# Altium footprint library XU-GENARAL PCB .PcbLib: 1176 footprints (part 24 of 75)
Each footprint in its own frame and in the unit in brackets; x right, y up, seen from the top. Pads: shape width x height; smd on the part's side, far side on the other; paste and mask are expansions set on the pad; w line width, h text height; cw(c..) or ccw(c..) is an arc to the next point about the centre after c.
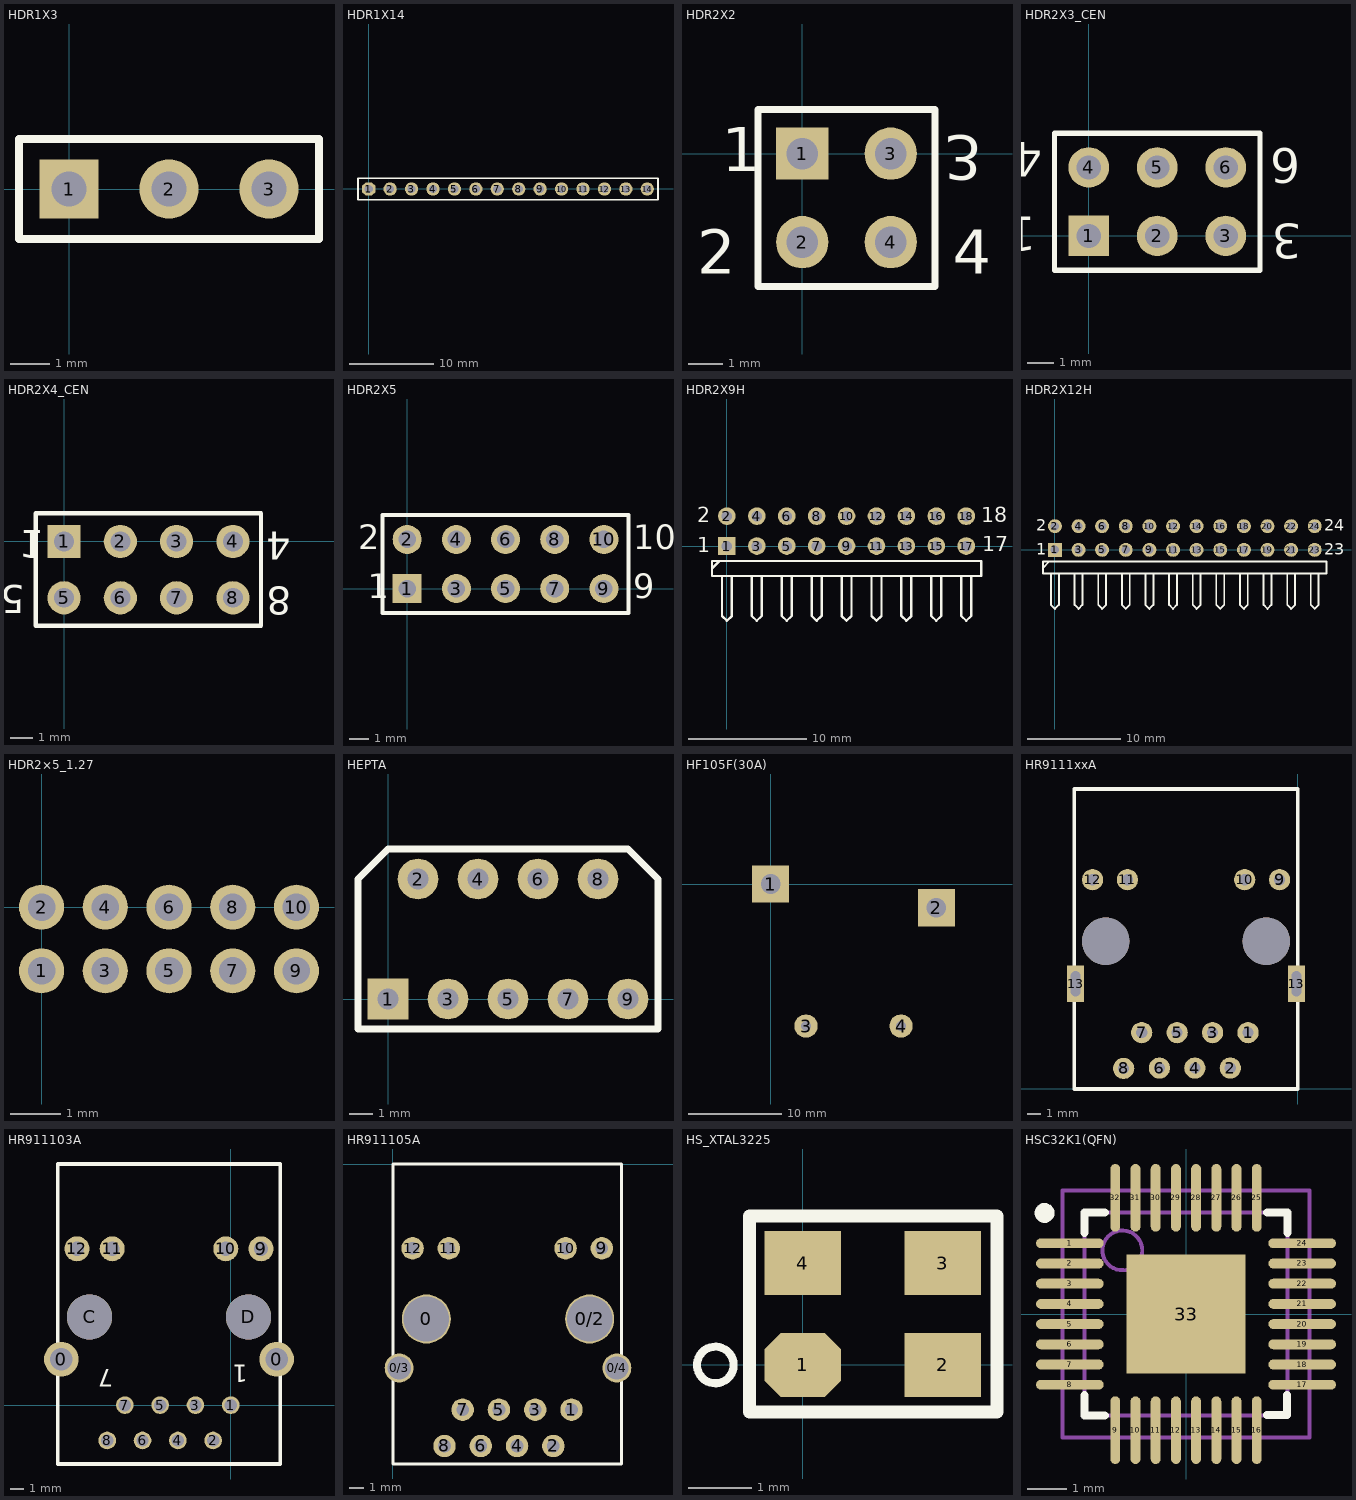
[diagram p23: the footprints below, top view; thin cyan lines are the x and y axes]

## HDR1X3 [mm] "Connector; Header; 3 Position"
height 1.75
pads (3):
  rect 1.5x1.5 hole 0.9: 1(0,0)
  round 1.5 hole 0.9: 2(2.54,0) 3(5.08,0)
Top Overlay:
  lines w0.2: -1.27,-1.27 6.35,-1.27 6.35,1.27 -1.27,1.27 -1.27,-1.27

## HDR1X14 [mil]
pads (14):
  oct 62x62 hole 38: 1(-0.26,-0.26)
  round 62 hole 38: 2(99.74,-0.26) 3(199.74,-0.26) 4(299.74,-0.26) 5(399.74,-0.26) 6(499.74,-0.26) 7(599.74,-0.26) 8(699.74,-0.26) 9(799.74,-0.26) 10(899.74,-0.26) 11(999.74,-0.26) 12(1099.74,-0.26) 13(1199.74,-0.26) 14(1299.74,-0.26)
Top Overlay:
  lines w8: -50.26,-50.26 1349.74,-50.26 1349.74,49.74 24.74,49.74 -50.26,49.74 -50.26,-50.26

## HDR2X2 [mm] "Connector; Header; 2x2 Position"
height 1.75
pads (4):
  rect 1.5x1.5 hole 0.9: 1(0,0)
  round 1.5 hole 0.9: 2(0,-2.54) 3(2.54,0) 4(2.54,-2.54)
Top Overlay:
  lines w0.2: -1.27,-3.81 3.81,-3.81 3.81,1.27 -1.27,1.27 -1.27,-3.81
  text "1" at -2.311,-0.508 h1.27
  text "2" at -3.023,-3.454 h1.27
  text "4" at 4.318,-3.454 h1.27
  text "3" at 4.064,0.508 h1.27

## HDR2X3_CEN [mm] "Connector; Header; 3x2 Position"
height 1.75
pads (6):
  rect 1.5x1.5 hole 0.9: 1(0,0)
  round 1.5 hole 0.9: 2(2.54,0) 3(5.08,0) 4(0,2.54) 5(2.54,2.54) 6(5.08,2.54)
Top Overlay:
  lines w0.2: -1.27,-1.27 -1.27,3.81 6.35,3.81 6.35,-1.27 -1.27,-1.27
  text "4" at -1.727,3.48 h1.27
  text "1" at -1.956,0.711 h1.27
  text "3" at 7.899,0.457 h1.27
  text "6" at 7.849,3.251 h1.27

## HDR2X4_CEN [mm] "Connector; Header; 4x2 Position"
height 1.75
pads (8):
  rect 1.5x1.5 hole 0.9: 1(0,0)
  round 1.5 hole 0.9: 2(2.54,0) 3(5.08,0) 4(7.62,0) 5(0,-2.54) 6(2.54,-2.54) 7(5.08,-2.54) 8(7.62,-2.54)
Top Overlay:
  lines w0.2: -1.27,-3.81 8.89,-3.81 8.89,1.27 -1.27,1.27 -1.27,-3.81
  text "8" at 9.144,-2.032 h1.27
  text "4" at 10.236,0.432 h1.27
  text "1" at -2.032,0.508 h1.27
  text "5" at -1.778,-1.981 h1.27

## HDR2X5 [mm] "Connector; Header; 5x2 Position"
height 1.75
pads (10):
  rect 1.5x1.5 hole 0.9: 1(0,0)
  round 1.5 hole 0.9: 2(0,2.54) 3(2.54,0) 4(2.54,2.54) 5(5.08,0) 6(5.08,2.54) 7(7.62,0) 8(7.62,2.54) 9(10.16,0) 10(10.16,2.54)
Top Overlay:
  lines w0.2: -1.27,-1.27 -1.27,3.81 11.43,3.81 11.43,-1.27 -1.27,-1.27
  text "2" at -2.54,2.032 h1.27
  text "1" at -2.032,-0.508 h1.27
  text "9" at 11.684,-0.508 h1.27
  text "10" at 11.684,2.032 h1.27

## HDR2X9H [mm] "Connector; Header; 9x2 Position; Right Angle"
height 1.75
pads (18):
  rect 1.5x1.5 hole 0.9: 1(0,0)
  round 1.5 hole 0.9: 2(0,2.54) 3(2.54,0) 4(2.54,2.54) 5(5.08,0) 6(5.08,2.54) 7(7.62,0) 8(7.62,2.54) 9(10.16,0) 10(10.16,2.54) 11(12.7,0) 12(12.7,2.54) 13(15.24,0) 14(15.24,2.54) 15(17.78,0) 16(17.78,2.54) 17(20.32,0) 18(20.32,2.54)
Top Overlay:
  lines w0.2: -1.27,-1.905 -0.635,-1.27 ; -0.423,-2.54 -0.423,-5.927 0,-6.35 0.423,-5.927 0.423,-2.54 ; 2.117,-2.54 2.117,-5.927 2.54,-6.35 2.963,-5.927 2.963,-2.54 ; 4.657,-2.54 4.657,-5.927 5.08,-6.35 5.503,-5.927 5.503,-2.54 ; 7.197,-2.54 7.197,-5.927 7.62,-6.35 8.043,-5.927 8.043,-2.54 ; 9.737,-2.54 9.737,-5.927 10.16,-6.35 10.583,-5.927 10.583,-2.54 ; 12.277,-2.54 12.277,-5.927 12.7,-6.35 13.123,-5.927 13.123,-2.54 ; 14.817,-2.54 14.817,-5.927 15.24,-6.35 15.663,-5.927 15.663,-2.54 ; 17.357,-2.54 17.357,-5.927 17.78,-6.35 18.203,-5.927 18.203,-2.54 ; 19.897,-2.54 19.897,-5.927 20.32,-6.35 20.743,-5.927 20.743,-2.54 ; -1.27,-2.54 -1.27,-1.27 21.59,-1.27 21.59,-2.54 -1.27,-2.54
  text "1" at -2.54,-0.508 h1.27
  text "17" at 21.664,-0.44 h1.27
  text "18" at 21.593,2.032 h1.27
  text "2" at -2.54,2.032 h1.27

## HDR2X12H [mm] "Connector; Header; 12x2 Position; Right Angle"
height 1.75
pads (24):
  rect 1.5x1.5 hole 0.9: 1(0,0)
  round 1.5 hole 0.9: 2(0,2.54) 3(2.54,0) 4(2.54,2.54) 5(5.08,0) 6(5.08,2.54) 7(7.62,0) 8(7.62,2.54) 9(10.16,0) 10(10.16,2.54) 11(12.7,0) 12(12.7,2.54) 13(15.24,0) 14(15.24,2.54) 15(17.78,0) 16(17.78,2.54) 17(20.32,0) 18(20.32,2.54) 19(22.86,0) 20(22.86,2.54) 21(25.4,0) 22(25.4,2.54) 23(27.94,0) 24(27.94,2.54)
Top Overlay:
  lines w0.2: -1.27,-1.905 -0.635,-1.27 ; -0.423,-2.54 -0.423,-5.927 0,-6.35 0.423,-5.927 0.423,-2.54 ; 2.117,-2.54 2.117,-5.927 2.54,-6.35 2.963,-5.927 2.963,-2.54 ; 4.657,-2.54 4.657,-5.927 5.08,-6.35 5.503,-5.927 5.503,-2.54 ; 7.197,-2.54 7.197,-5.927 7.62,-6.35 8.043,-5.927 8.043,-2.54 ; 9.737,-2.54 9.737,-5.927 10.16,-6.35 10.583,-5.927 10.583,-2.54 ; 12.277,-2.54 12.277,-5.927 12.7,-6.35 13.123,-5.927 13.123,-2.54 ; 14.817,-2.54 14.817,-5.927 15.24,-6.35 15.663,-5.927 15.663,-2.54 ; 17.357,-2.54 17.357,-5.927 17.78,-6.35 18.203,-5.927 18.203,-2.54 ; 19.897,-2.54 19.897,-5.927 20.32,-6.35 20.743,-5.927 20.743,-2.54 ; 22.437,-2.54 22.437,-5.927 22.86,-6.35 23.283,-5.927 23.283,-2.54 ; 24.977,-2.54 24.977,-5.927 25.4,-6.35 25.823,-5.927 25.823,-2.54 ; 27.517,-2.54 27.517,-5.927 27.94,-6.35 28.363,-5.927 28.363,-2.54 ; -1.27,-2.54 29.21,-2.54 29.21,-1.27 -1.27,-1.27 -1.27,-2.54
  text "1" at -2.032,-0.508 h1.27
  text "2" at -2.032,2.032 h1.27
  text "23" at 28.956,-0.508 h1.27
  text "24" at 28.956,2.032 h1.27

## HDR2×5_1.27 [mm]
pads (10):
  round 0.9 hole 0.55: 1(0,-1.27) 2(0,0) 3(1.27,-1.27) 4(1.27,0) 5(2.54,-1.27) 6(2.54,0) 7(3.81,-1.27) 8(3.81,0) 9(5.08,-1.27) 10(5.08,0)

## HEPTA [mil]
pads (9):
  rect 68x68 hole 35: 1(0,0)
  round 68 hole 35: 2(50,200) 3(100,0) 4(150,200) 5(200,0) 6(250,200) 7(300,0) 8(350,200) 9(400,0)
Top Overlay:
  lines w12: -50,-50 450,-50 450,200 400,250 0,250 -50,200 -50,-50

## HF105F(30A) [mm]
pads (4):
  rect 4x4 hole 2.1: 1(0,0) 2(17.8,-2.54)
  round 2.5 hole 1.1: 3(3.8,-15.24) 4(14,-15.24)
Bottom Overlay:
  lines w0.127: 3.048,0 6.604,0 6.604,2.032 ; 5.461,-15.24 6.477,-15.24 ; 6.604,3.556 8.636,1.524 18.288,1.524 18.288,-0.127 ; 12.319,-15.24 11.557,-15.24 ; 6.477,-15.24 6.477,-16.256 9.525,-16.256 11.557,-16.256 11.557,-15.24 ; 6.477,-15.24 6.477,-14.224 9.525,-14.224 11.557,-14.224 11.557,-15.24
  lines w0.254: -5.3,-2.6 -0.7,-2.6 -0.7,-22 19.3,-22 19.3,-7.4 21.7,-7.4 21.7,10.2 -5.3,10.2 -5.3,-2.6

## HR9111xxA [mm]
pads (16):
  round 1.524 hole 0.8: 1(-3.56,4.04) 2(-4.83,1.5) 3(-6.1,4.04) 4(-7.37,1.5) 5(-8.64,4.04) 6(-9.91,1.5) 7(-11.18,4.04) 8(-12.475,1.475) 9(-1.3,15) 10(-3.8,15) 11(-12.2,15) 12(-14.7,15)
  rect 1.2x2.6 hole 0.7 slot 1.8 at 90 deg: 13(-15.92,7.54) 13(-0.09,7.54)
  round 3.4 hole 3.4: ""(-13.76,10.59) ""(-2.25,10.59)
Top Overlay:
  lines w0.254: -16.01,0 -16.01,21.5 0,21.5 0,0 -16.01,0

## HR911103A [mm]
pads (16):
  round 2.5 hole 1.63: 0(-12.19,3.3) 0(3.3,3.3)
  round 1.27 hole 0.889: 1(0,0) 2(-1.27,-2.54) 3(-2.54,0) 4(-3.81,-2.54) 5(-5.08,0) 6(-6.35,-2.54) 7(-7.62,0) 8(-8.89,-2.54)
  round 1.8 hole 1.02: 9(2.18,11.25) 10(-0.36,11.25) 11(-8.53,11.25) 12(-11.07,11.25)
  round 3.25 hole 3.25: C(-10.16,6.35) D(1.27,6.35)
Top Overlay:
  lines w0.254: -12.445,-4.233 3.555,-4.233 3.555,17.35 -12.445,17.35 -12.445,-4.233
  text "7" at -8.444,2.567 h1.27
  text "1" at 1.215,2.899 h1.27

## HR911105A [mil]
pads (16):
  round 135 hole 125: 0(92.13,-427.16) 0/2(542.13,-427.16)
  round 80 hole 64.17: 0/3(17.13,-562.16) 0/4(617.13,-562.16)
  round 62 hole 35: 1(492.13,-677.16) 2(442.13,-777.16) 3(392.13,-677.16) 4(342.13,-777.16) 5(292.13,-677.16) 6(242.13,-777.16) 7(192.13,-677.16) 8(142.13,-777.16) 9(575.79,-232.28) 10(475.79,-232.28) 11(154.13,-232.28) 12(54.13,-232.28)
Top Overlay:
  lines w8: 0,-826.77 0,0 629.92,0 629.92,-826.77 0,-826.77

## HS_XTAL3225 [mm]
height 0.8
pads (4):
  oct 1.2x1 smd: 1(0,0)
  rect 1.2x1 smd: 2(2.2,0) 3(2.2,1.6) 4(0,1.6)
Top Overlay:
  circle w0.127: c-1.372,0 r0.287
  lines w0.203: -0.838,-0.737 3.048,-0.737 3.048,2.337 -0.838,2.337 -0.838,-0.737

## HSC32K1(QFN) [mm] "QFN, 32-Leads, Body 5.1x5.1mm (max), Pitch 0.50mm, IPC Medium Density"
height 0.8
pads (33):
  oval 1.7x0.25 smd: 1(-2.921,1.778) 2(-2.921,1.27) 3(-2.921,0.762) 4(-2.921,0.254) 5(-2.921,-0.254) 6(-2.921,-0.762) 7(-2.921,-1.27) 8(-2.921,-1.778) 17(2.921,-1.778) 18(2.921,-1.27) 19(2.921,-0.762) 20(2.921,-0.254) 21(2.921,0.254) 22(2.921,0.762) 23(2.921,1.27) 24(2.921,1.778)
  oval 0.25x1.7 smd: 9(-1.778,-2.921) 10(-1.27,-2.921) 11(-0.762,-2.921) 12(-0.254,-2.921) 13(0.254,-2.921) 14(0.762,-2.921) 15(1.27,-2.921) 16(1.778,-2.921) 25(1.778,2.921) 26(1.27,2.921) 27(0.762,2.921) 28(0.254,2.921) 29(-0.254,2.921) 30(-0.762,2.921) 31(-1.27,2.921) 32(-1.778,2.921)
  rect 3x3 smd: 33(0,0)
Top Overlay:
  circle w0.25: c-3.554,2.54 r0.125
  lines w0.2: -2.55,-2.525 -2.55,-2.55 -2.525,-2.55 ; -2.55,2.525 -2.55,2.55 -2.525,2.55 ; 2.525,2.55 2.55,2.55 2.55,2.525
  lines w0.203: -2.55,-2.525 -2.55,-2.042 ; -2.55,2.042 -2.55,2.525 ; -2.55,2.55 -2.042,2.55 ; -2.525,-2.55 -2.042,-2.55 ; 2.032,-2.54 2.54,-2.54 2.54,-2.032 ; 2.042,2.55 2.55,2.55 ; 2.55,2.042 2.55,2.525
Mechanical 13:
  circle w0.1: c-1.6,1.6 r0.5
  lines w0.1: -2.55,-2.55 -2.55,2.55 2.55,2.55 2.55,-2.55 -2.55,-2.55
Mechanical 15:
  lines w0.1: -0.5,0 0.5,0 ; 0,-0.5 0,0.5 ; -3.1,-3.1 -3.1,3.1 3.1,3.1 3.1,-3.1 -3.1,-3.1
3D body: height 0.8, standoff 0.01, extent -2.55,-2.55 2.55,2.55